# Altium footprint library d1_PcbLib.PcbLib: 266 footprints (part 15 of 17)
Each footprint in its own frame and in the unit in brackets; x right, y up, seen from the top. Pads: shape width x height; smd on the part's side, far side on the other; paste and mask are expansions set on the pad; w line width, h text height; cw(c..) or ccw(c..) is an arc to the next point about the centre after c.
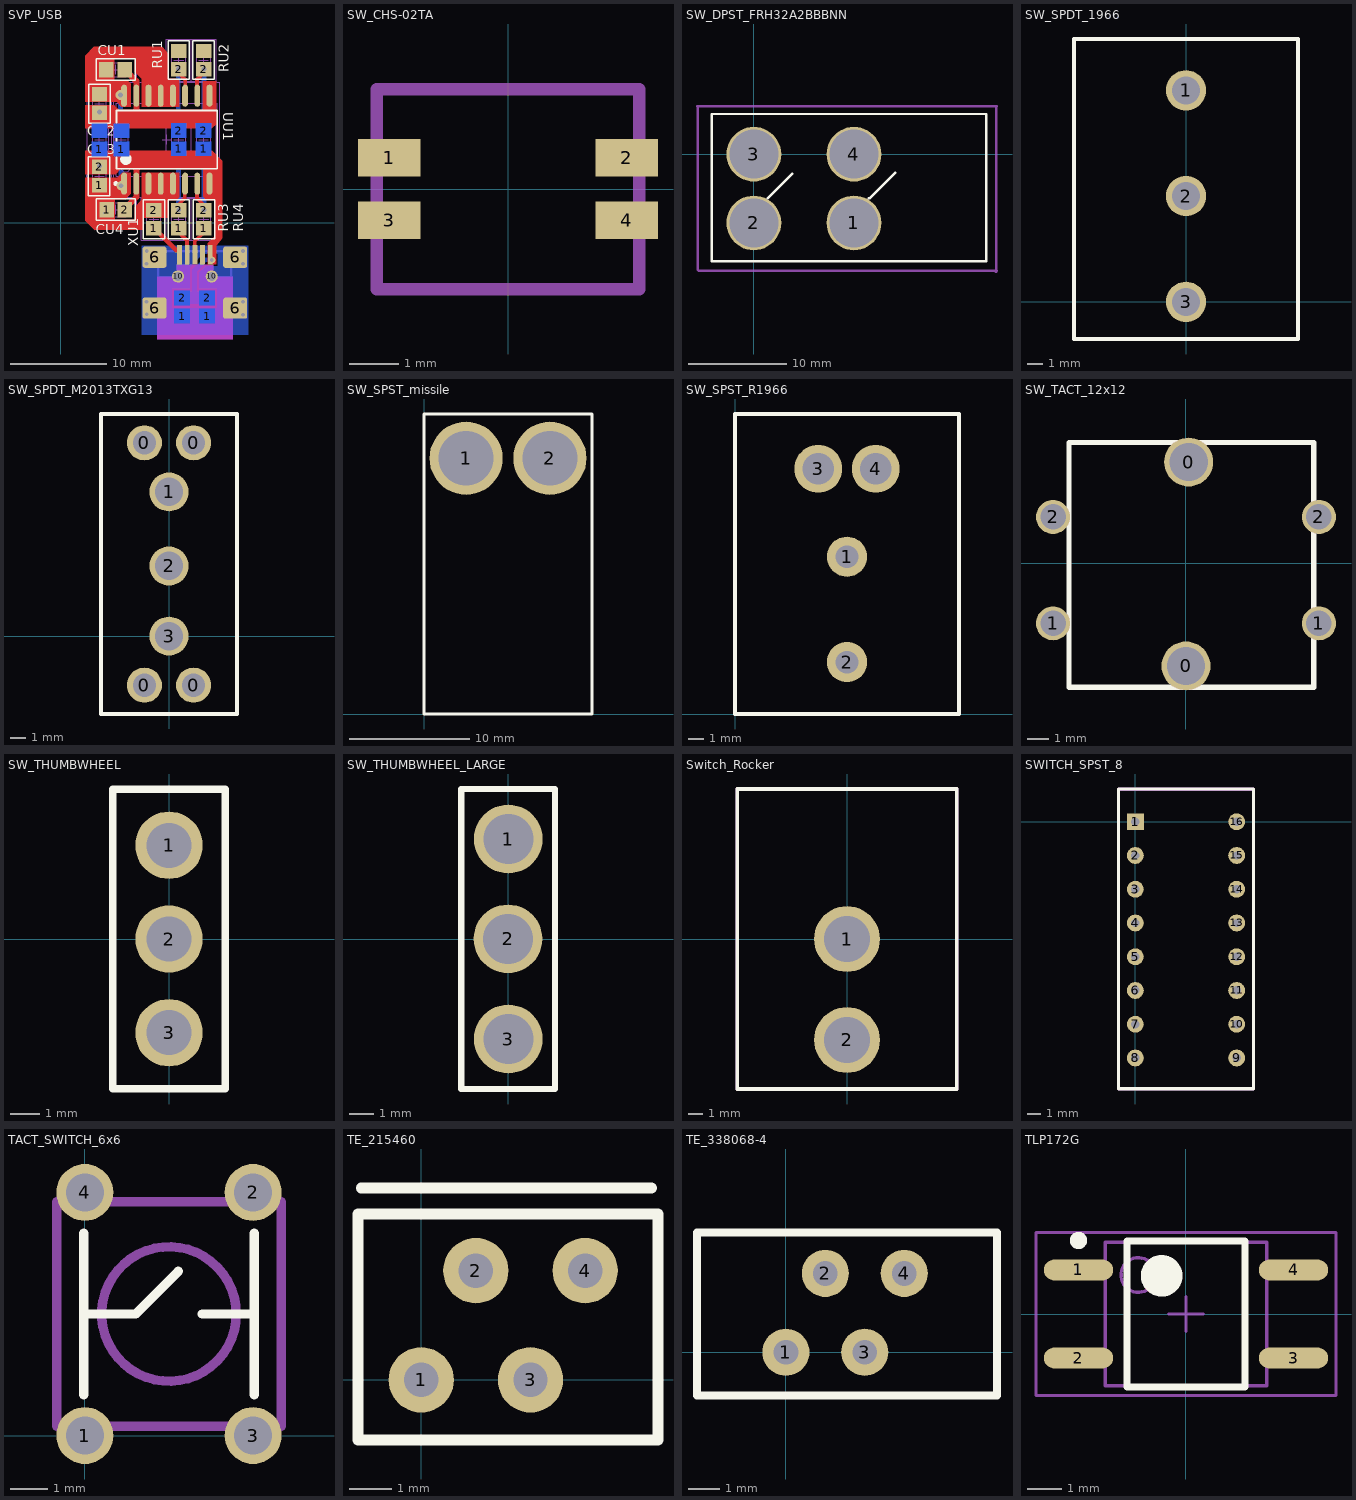
[diagram p14: the footprints below, top view; thin cyan lines are the x and y axes]

## SVP_USB [mm]
pads (57):
  rect 1.6x1.5 smd: 1(4.039,3.901) 1(9.703,-0.594) 1(12.294,-0.594) 1(14.91,-0.594) 2(4.039,5.801) 2(9.703,1.306) 2(12.294,1.306) 2(12.294,15.966) 2(14.884,15.966) 2(14.91,1.306) +3.3D(4.039,13.345) DGND(4.039,11.445) USB_N(12.294,17.866) USB_P(14.884,17.866)
  rect 1.6x1.5 smd far side: 1(4.039,7.661) 1(6.325,7.661) 1(12.294,7.686) 1(12.649,-9.738) 1(14.884,7.686) 1(15.24,-9.738) 2(12.294,9.586) 2(12.649,-7.838) 2(14.884,9.586) 2(15.24,-7.838) +3.3D(6.325,9.561) DGND(4.039,9.561)
  rect 1.5x1.6 smd: 1(4.79,1.346) 2(6.69,1.346) +3.3D(4.765,15.926) DGND(6.665,15.926)
  oval 0.6x2.3 smd: 1(6.604,4.061) 2(7.874,4.061) 3(9.144,4.061) 4(10.414,4.061) 5(11.684,4.061) 6(12.954,4.061) 7(14.224,4.061) 8(15.494,4.061) 10(14.224,13.211) 11(12.954,13.211) +3.3D(6.604,13.211) +3.3D(9.144,13.211) +3.3D(10.414,13.211) +3.3D(11.684,13.211) DGND(7.874,13.211) DGND(15.494,13.211)
  rect 0.5x2 smd: 1(12.37,-3.353) 2(13.17,-3.353) 3(13.97,-3.353) 4(14.77,-3.353) 5(15.57,-3.353)
  rrect20% 2.5x2.2 smd: 6(9.77,-8.903) 6(9.77,-3.603) 6(18.17,-8.903) 6(18.17,-3.603)
  round 1.27 hole 0.9: 10(12.22,-5.603) 10(15.72,-5.603)
via 6.223,13.284 diameter 1.016 hole 0.508
via 8.966,-2.946 diameter 0.762 hole 0.381
via 8.941,-4.293 diameter 0.762 hole 0.381
via 8.941,-8.23 diameter 0.762 hole 0.381
via 8.966,-9.55 diameter 0.762 hole 0.381
via 18.974,-9.576 diameter 0.762 hole 0.381
via 18.974,-8.23 diameter 0.762 hole 0.381
via 18.974,-4.267 diameter 0.762 hole 0.381
via 18.974,-2.946 diameter 0.762 hole 0.381
via 15.723,-3.886 diameter 0.762 hole 0.381
via 12.243,15.977 diameter 1.016 hole 0.508
via 14.91,15.977 diameter 1.016 hole 0.508
via 12.294,1.295 diameter 1.016 hole 0.508
via 14.91,1.321 diameter 1.016 hole 0.508
via 6.299,3.835 diameter 1.016 hole 0.508
via 4.039,5.893 diameter 1.016 hole 0.508
via 4.039,11.506 diameter 1.016 hole 0.508
Top Layer:
  region: 2.565,4.674 5.867,4.674 6.401,5.207 7.29,5.207 7.29,2.997 6.731,2.438 5.613,2.438 5.613,0.279 7.696,0.279 7.696,1.626 8.458,2.388 8.458,5.207 12.344,5.207 12.344,2.642 12.014,2.311 11.201,2.311 11.201,0.483 8.636,0.483 8.636,-0.762 3.531,-0.787 2.565,0.178
  region: 2.54,5.029 5.715,5.029 6.223,5.537 14.834,5.537 14.834,2.676 15.18,2.311 15.977,2.311 15.977,-1.448 15.291,-2.159 15.291,-4.343 16.18,-4.343 16.18,-2.413 16.84,-1.651 16.84,6.426 15.773,7.493 2.54,7.493
  region: 7.29,12.065 6.325,12.065 5.817,12.573 2.54,12.573 2.54,17.374 3.454,18.313 10.566,18.313 11.201,17.602 11.201,14.961 12.141,14.961 12.344,14.757 12.344,12.065 8.458,12.065 8.458,14.986 7.722,15.723 7.722,17.069 5.588,17.069 5.588,14.834 6.934,14.834 7.29,14.478
  region: 2.54,12.217 5.588,12.217 6.071,11.735 14.808,11.76 14.808,14.707 16.18,14.707 16.18,10.222 15.748,9.804 2.54,9.804
  lines w0.381: 12.167,-0.864 13.157,-1.854 13.157,-2.642 ; 12.344,1.956 12.929,2.54 12.929,3.353 ; 12.421,15.443 12.954,14.91 12.954,13.995 ; 13.97,-2.921 13.97,-1.93 14.935,-0.965 ; 14.199,3.454 14.199,2.54 14.961,1.778 ; 14.199,13.894 14.199,14.91 15.037,15.748
  lines w0.508: 9.906,-0.762 11.989,-2.845 12.319,-2.845
  lines w0.635: 6.807,15.799 7.874,14.732 7.874,10.744 ; 7.087,1.88 7.874,2.667 7.874,5.969
Bottom Layer:
  region: 8.433,-2.413 8.433,-11.684 19.507,-11.684 19.507,-2.413 16.358,-2.413 16.358,-4.521 15.138,-4.521 14.453,-5.207 14.453,-6.833 16.307,-6.833 16.307,-8.89 11.582,-8.89 11.582,-6.833 13.437,-6.833 13.437,-4.648 14.834,-3.251 16.358,-3.251 16.358,-2.413
  lines w0.508: 4.039,5.893 4.039,7.849 ; 4.039,9.55 4.039,11.506 ; 6.223,9.271 6.223,13.259 ; 6.299,3.835 6.299,7.722 ; 12.243,9.576 12.243,15.977 ; 12.268,1.295 12.268,7.823 ; 13.945,-7.823 13.945,-4.953 15.037,-3.861 15.723,-3.861 ; 14.91,1.321 14.91,7.823 ; 14.91,9.677 14.91,15.977
  lines w1.27: 12.598,-7.823 15.215,-7.823
Top Overlay:
  circle w0.25: c5.754,4.061 r0.125
  circle w0.6: c6.799,6.611 r0.3
  lines w0.152: 2.896,2.819 5.131,2.819 5.131,6.858 2.896,6.858 2.896,2.819 ; 2.921,10.363 5.156,10.363 5.156,14.402 2.921,14.402 2.921,10.363 ; 3.708,0.229 7.747,0.229 7.747,2.464 3.708,2.464 3.708,0.229 ; 3.708,14.808 3.708,17.043 7.747,17.043 7.747,14.808 3.708,14.808 ; 8.585,-1.676 10.82,-1.676 10.82,2.362 8.585,2.362 8.585,-1.676 ; 11.176,-1.676 13.411,-1.676 13.411,2.362 11.176,2.362 11.176,-1.676 ; 11.176,14.91 13.411,14.91 13.411,18.948 11.176,18.948 11.176,14.91 ; 13.741,14.91 15.977,14.91 15.977,18.948 13.741,18.948 13.741,14.91 ; 13.792,-1.676 16.027,-1.676 16.027,2.362 13.792,2.362 13.792,-1.676
  lines w0.2: 5.799,5.611 16.299,5.611 16.299,11.661 5.799,11.661 5.799,5.611
  text "RU1" at 10.592,16.002 h1.02
  text "RU2" at 17.501,15.646 h1.02
  text "RU3" at 17.45,-0.965 h1.02
  text "RU4" at 18.999,-0.94 h1.02
  text "CU1" at 3.861,17.45 h1.02
  text "CU2" at 2.743,9.042 h1.02
  text "CU4" at 3.658,-1.219 h1.02
  text "CU3" at 2.743,7.137 h1.02
  text "XU1" at 8.077,-2.438 h1.02
  text "UU1" at 16.942,11.481 h1.02
Bottom Overlay:
  lines w0.152: 5.182,6.579 7.417,6.579 7.417,10.617 5.182,10.617 ; 5.182,6.579 5.182,10.617 ; 5.182,6.579 2.946,6.579 2.946,10.617 5.182,10.617 ; 5.182,6.579 5.182,10.617 ; 11.176,6.604 13.411,6.604 13.411,10.643 11.176,10.643 11.176,6.604 ; 11.506,-10.846 13.741,-10.846 13.741,-6.807 11.506,-6.807 11.506,-10.846 ; 13.767,6.604 16.002,6.604 16.002,10.643 13.767,10.643 13.767,6.604 ; 14.122,-10.846 16.358,-10.846 16.358,-6.807 14.122,-6.807 14.122,-10.846
  text "RU5" at 2.565,10.008 h1.02
  text "RU6" at 8.712,10.084 h1.02
  text "RU7" at 10.77,10.084 h1.02
  text "RU8" at 17.374,10.109 h1.02
  text "CU7" at 16.637,-10.363 h1.02
  text "RU9" at 10.058,-10.236 h1.02
Mechanical 13:
  circle w0.1: c6.749,5.786 r0.5
  lines w0.1: 3.314,3.751 3.314,5.951 4.764,5.951 4.764,3.751 3.314,3.751 ; 3.314,7.511 4.764,7.511 4.764,9.711 3.314,9.711 3.314,7.511 ; 3.314,11.295 3.314,13.495 4.764,13.495 4.764,11.295 3.314,11.295 ; 4.615,15.201 4.615,16.651 6.815,16.651 6.815,15.201 4.615,15.201 ; 4.64,0.621 6.84,0.621 6.84,2.071 4.64,2.071 4.64,0.621 ; 5.6,7.511 5.6,9.711 7.05,9.711 7.05,7.511 5.6,7.511 ; 5.799,4.836 16.299,4.836 16.299,12.436 5.799,12.436 5.799,4.836 ; 8.978,-0.744 8.978,1.456 10.428,1.456 10.428,-0.744 8.978,-0.744 ; 11.569,-0.744 11.569,1.456 13.019,1.456 13.019,-0.744 11.569,-0.744 ; 11.569,7.536 11.569,9.736 13.019,9.736 13.019,7.536 11.569,7.536 ; 11.569,15.816 11.569,18.016 13.019,18.016 13.019,15.816 11.569,15.816 ; 11.924,-9.888 11.924,-7.688 13.374,-7.688 13.374,-9.888 11.924,-9.888 ; 14.159,7.536 14.159,9.736 15.609,9.736 15.609,7.536 14.159,7.536 ; 14.159,15.816 14.159,18.016 15.609,18.016 15.609,15.816 14.159,15.816 ; 14.185,-0.744 14.185,1.456 15.635,1.456 15.635,-0.744 14.185,-0.744 ; 14.515,-9.888 14.515,-7.688 15.965,-7.688 15.965,-9.888 14.515,-9.888
  lines w0.254: 10.16,-11.989 17.78,-11.989 17.78,-2.972 10.16,-2.972 10.16,-11.989
Mechanical 15:
  lines w0.1: 2.739,6.411 5.339,6.411 5.339,10.811 2.739,10.811 ; 2.739,10.195 5.339,10.195 5.339,14.595 2.739,14.595 ; 2.748,2.651 2.748,7.051 ; 2.748,6.411 2.748,10.811 ; 2.748,10.195 2.748,14.595 ; 3.539,4.851 4.539,4.851 ; 3.539,8.611 4.539,8.611 ; 3.539,12.395 4.539,12.395 ; 4.039,4.351 4.039,5.351 ; 4.039,8.111 4.039,9.111 ; 4.039,11.895 4.039,12.895 ; 5.025,6.411 5.025,10.811 ; 5.215,15.926 6.215,15.926 ; 5.24,1.346 6.24,1.346 ; 5.715,15.426 5.715,16.426 ; 5.74,0.846 5.74,1.846 ; 5.825,8.611 6.825,8.611 ; 6.325,8.111 6.325,9.111 ; 9.203,0.356 10.203,0.356 ; 9.703,-0.144 9.703,0.856 ; 10.549,8.636 11.549,8.636 ; 11.049,8.136 11.049,9.136 ; 11.794,0.356 12.794,0.356 ; 11.794,8.636 12.794,8.636 ; 11.794,16.916 12.794,16.916 ; 12.149,-8.788 13.149,-8.788 ; 12.294,-0.144 12.294,0.856 ; 12.294,8.136 12.294,9.136 ; 12.294,16.416 12.294,17.416 ; 12.649,-9.288 12.649,-8.288 ; 14.384,8.636 15.384,8.636 ; 14.384,16.916 15.384,16.916 ; 14.41,0.356 15.41,0.356 ; 14.74,-8.788 15.74,-8.788 ; 14.884,8.136 14.884,9.136 ; 14.884,16.416 14.884,17.416 ; 14.91,-0.144 14.91,0.856 ; 15.24,-9.288 15.24,-8.288 ; 2.739,2.651 2.739,7.051 5.339,7.051 5.339,2.651 2.739,2.651 ; 3.515,14.626 3.515,17.226 7.915,17.226 7.915,14.626 3.515,14.626 ; 3.54,0.046 7.94,0.046 7.94,2.646 3.54,2.646 3.54,0.046 ; 5.549,2.661 16.549,2.661 16.549,14.611 5.549,14.611 5.549,2.661 ; 8.403,-1.844 8.403,2.556 11.003,2.556 11.003,-1.844 8.403,-1.844 ; 10.994,-1.844 10.994,2.556 13.594,2.556 13.594,-1.844 10.994,-1.844 ; 10.994,6.436 10.994,10.836 13.594,10.836 13.594,6.436 10.994,6.436 ; 10.994,14.716 10.994,19.116 13.594,19.116 13.594,14.716 10.994,14.716 ; 11.349,-10.988 11.349,-6.588 13.949,-6.588 13.949,-10.988 11.349,-10.988 ; 13.584,6.436 13.584,10.836 16.184,10.836 16.184,6.436 13.584,6.436 ; 13.584,14.716 13.584,19.116 16.184,19.116 16.184,14.716 13.584,14.716 ; 13.61,-1.844 13.61,2.556 16.21,2.556 16.21,-1.844 13.61,-1.844 ; 13.94,-10.988 13.94,-6.588 16.54,-6.588 16.54,-10.988 13.94,-10.988
Mechanical 15 keep-out:
  region: 12.065,-4.369 15.875,-4.369 15.875,-5.639 17.907,-5.639 17.907,-12.116 10.033,-12.116 10.033,-5.639 12.065,-5.639
3D body: height 2.57, standoff -0.03, extent 5.842,3.336 16.342,13.936
3D body: height 0.5, standoff -0.01, extent 8.941,-1.168 10.465,1.88
3D body: height 0.5, standoff -0.01, extent 11.887,-10.262 13.411,-7.214
3D body: height 0.5, standoff -0.01, extent 5.563,7.087 7.087,10.135
3D body: height 0.5, standoff -0.01, extent 3.277,7.087 4.801,10.135
3D body: height 0.5, standoff -0.01, extent 11.532,7.112 13.056,10.16
3D body: height 0.5, standoff -0.01, extent 14.122,7.112 15.646,10.16
3D body: height 0.5, standoff -0.01, extent 11.532,15.392 13.056,18.44
3D body: height 0.5, standoff -0.01, extent 14.122,15.392 15.646,18.44
3D body: height 0.5, standoff -0.01, extent 11.532,-1.168 13.056,1.88
3D body: height 0.5, standoff -0.01, extent 14.148,-1.168 15.672,1.88
3D body: height 1.24, standoff -0.03, extent 14.503,-10.541 16.027,-7.239
3D body: height 1.24, standoff -0.03, extent 4.089,0.584 7.391,2.108
3D body: height 1.24, standoff -0.03, extent 4.064,15.164 7.366,16.688
3D body: height 1.24, standoff -0.03, extent 3.277,3.2 4.801,6.502
3D body: height 1.24, standoff -0.03, extent 3.277,10.744 4.801,14.046
3D body: height 4.12, standoff -0.97, extent 8.998,-11.839 18.898,-2.639

## SW_CHS-02TA [mil]
pads (4):
  rect 50x30 smd: 1(-95,25) 2(95,25) 3(-95,-25) 4(95,-25)
Mechanical 13:
  lines w10: -105,-80 -105,80 105,80 105,-80 -105,-80
3D body: height 98.43, standoff 0, extent -104.98,-79.98 104.98,79.98

## SW_DPST_FRH32A2BBBNN [mil]
pads (4):
  round 220 hole 197: 1(402,-276) 2(0,-276) 3(0,0) 4(402,0)
Top Overlay:
  lines w10: 55.12,-177.17 153.54,-78.74 ; 460.63,-177.17 464.57,-177.17 566.93,-74.8 ; -169.29,-429.13 933.07,-429.13 933.07,161.42 -153.54,161.42 -169.29,161.42 -169.29,-429.13
Mechanical 15:
  lines w10: -228.35,192.91 -177.17,192.91 ; -224.41,192.91 -224.41,-464.57 -220.47,-468.5 618.11,-468.5 ; -188.98,192.91 618.11,192.91 ; 602.36,-468.5 976.38,-468.5 ; 602.36,192.91 976.38,192.91 972.44,188.98 972.44,-472.44 968.5,-468.5

## SW_SPDT_1966 [mil] "e-switch R1996D"
pads (3):
  round 105 hole 73: 1(0,552) 2(0,276) 3(0,0)
Top Overlay:
  lines w10: -292,-97 -292,686 292,686 292,-97 -292,-97
3D body: height 630, standoff 0, extent -290,-100 290,685

## SW_SPDT_M2013TXG13 [mil]
pads (7):
  round 90 hole 60: 0(-63,-126) 0(-63,496) 0(63,-126) 0(63,496)
  round 100 hole 73: 1(0,370) 2(0,180) 3(0,0)
Top Overlay:
  lines w10: -175,-200 -175,570 175,570 175,-200 -175,-200
3D body: height 951, standoff -187, extent -185,-145.63 180,505.63

## SW_SPST_missile [mil] "sparkfun"
pads (2):
  round 240 hole 180: 1(138,839) 2(413,839)
Top Overlay:
  lines w10: 0,0 551,0 551,984 0,984 0,0
3D body: height 535, standoff 0, extent 0,0 550,985

## SW_SPST_R1966 [mil] "e-switch R1966A"
pads (4):
  round 105 hole 59: 1(292,410.5) 2(292,135.5)
  round 125 hole 82: 3(217,640) 4(367,640)
Top Overlay:
  lines w10: 0,0 0,783 584,783 584,0 0,0
3D body: height 778.74, standoff -551.18, extent 0,4.65 582.68,835.35

## SW_TACT_12x12 [mm] "B3F-4050"
pads (6):
  round 2.3 hole 1.8: 0(0.011,-4.827) 0(0.138,4.753)
  round 1.6 hole 1.2: 1(-6.239,-2.827) 1(6.261,-2.827) 2(-6.239,2.173) 2(6.261,2.173)
Top Overlay:
  lines w0.254: -5.489,-5.827 6.011,-5.827 6.011,5.673 -5.489,5.673 -5.489,-5.827
3D body: height 10.7, standoff -1.4, extent -5.831,-6.042 6.169,5.958

## SW_THUMBWHEEL [mil] "otto roller"
pads (3):
  round 90 hole 60: 1(-0.49,125.22) 2(-0.49,0.22) 3(-0.49,-124.78)
Top Overlay:
  lines w10: -75.49,-199.78 74.51,-199.78 74.51,200.22 -75.49,200.22 -75.49,-199.78

## SW_THUMBWHEEL_LARGE [mil] "otto roller"
pads (3):
  round 110 hole 80: 1(0,160) 2(-0.49,0.22) 3(0,-160)
Top Overlay:
  lines w10: -75.49,-240 74.51,-240 74.51,240 -75.49,240 -75.49,-240

## Switch_Rocker [mil]
pads (2):
  round 180 hole 125: 1(0,0) 2(0,-276)
Top Overlay:
  lines w10: -300,-410 300,-410 300,410 -300,410 -300,-410
Mechanical 13:
  lines w10: -300,-410 -300,410 300,410 300,-410 -300,-410
3D body: height 600, standoff 0, extent -299.98,-409.98 299.98,409.98

## SWITCH_SPST_8 [mm]
pads (16):
  rect 1.27x1.27 hole 0.635: 1(0,0)
  round 1.27 hole 0.635: 2(0,-2.54) 3(0,-5.08) 4(0,-7.62) 5(0,-10.16) 6(0,-12.7) 7(0,-15.24) 8(0,-17.78) 9(7.62,-17.78) 10(7.62,-15.24) 11(7.62,-12.7) 12(7.62,-10.16) 13(7.62,-7.62) 14(7.62,-5.08) 15(7.62,-2.54) 16(7.62,0)
Top Overlay:
  lines w0.254: -1.27,-20.091 -1.27,2.464 8.89,2.464 8.89,-20.091 -1.27,-20.091
Mechanical 13:
  lines w0.254: -1.27,-20.117 8.89,-20.117 8.89,2.438 -1.27,2.438 -1.27,-20.117
3D body: height 8.89, standoff 0, extent -0.991,-20.041 8.661,2.438

## TACT_SWITCH_6x6 [mil]
pads (4):
  round 60 hole 40: 1(0,0) 2(177.17,255.91) 3(177.17,0) 4(0,255.91)
Top Overlay:
  lines w10: -1.42,42.95 -1.42,212.95 ; -1.42,127.95 53.58,127.95 98.58,172.95 ; 123.58,127.95 178.58,127.95 ; 178.58,42.95 178.58,212.95
Mechanical 13:
  circle w10: c88.58,127.95 r70.87
  lines w10: -29.53,9.84 -29.53,246.06 206.69,246.06 206.69,9.84 -29.53,9.84
3D body: height 169, standoff -25, extent -29,0 207,255.39

## TE_215460 [mm] "Right-Angle mini-IDC header"
height 5.1
pads (4):
  round 1.524 hole 0.8: 1(0,0) 2(1.275,2.55) 3(2.55,0) 4(3.825,2.55)
Top Overlay:
  lines w0.254: -1.4,4.475 5.375,4.475 ; 5.5,3.875 -1.475,3.875 -1.475,-1.4 5.525,-1.4 5.525,3.875
3D body: height 5.6, standoff -3.3, extent -1.485,-1.4 5.525,3.9

## TE_338068-4 [mm] "Verticle latching mini-IDC header"
height 9.5
pads (4):
  round 1.524 hole 0.8: 1(0,0) 2(1.275,2.55) 3(2.55,0) 4(3.825,2.55)
Top Overlay:
  lines w0.254: -2.875,-1.4 6.825,-1.4 6.825,3.875 -2.875,3.875 -2.875,-1.4
3D body: height 4, standoff -3.1, extent -2.825,-1.275 6.725,3.725

## TLP172G [mm] "SOP, 4-Leads, Body 4.2x4.7mm (max), Pitch 2.54mm, IPC Medium Density"
height 2.1
pads (4):
  oval 2x0.6 smd: 1(-3.1,1.27) 2(-3.1,-1.27) 3(3.1,-1.27) 4(3.1,1.27)
Top Overlay:
  circle w0.25: c-3.1,2.12 r0.125
  circle w0.6: c-0.7,1.1 r0.3
  lines w0.2: -1.7,-2.1 -1.7,2.1 1.7,2.1 1.7,-2.1 -1.7,-2.1
Mechanical 13:
  circle w0.1: c-1.375,1.125 r0.5
  lines w0.1: -2.325,-2.075 -2.325,2.075 2.325,2.075 2.325,-2.075 -2.325,-2.075
Mechanical 15:
  lines w0.1: -0.5,0 0.5,0 ; 0,-0.5 0,0.5 ; -4.325,-2.35 -4.325,2.35 4.325,2.35 4.325,-2.35 -4.325,-2.35
3D body: height 2.1, standoff 0.1, extent -2.325,-2.075 2.325,2.075